# Altium footprint library con-molex.PCBLIB: 369 footprints (part 18 of 26)
Each footprint in its own frame and in the unit in brackets; x right, y up, seen from the top. Pads: shape width x height; smd on the part's side, far side on the other; paste and mask are expansions set on the pad; w line width, h text height; cw(c..) or ccw(c..) is an arc to the next point about the centre after c.
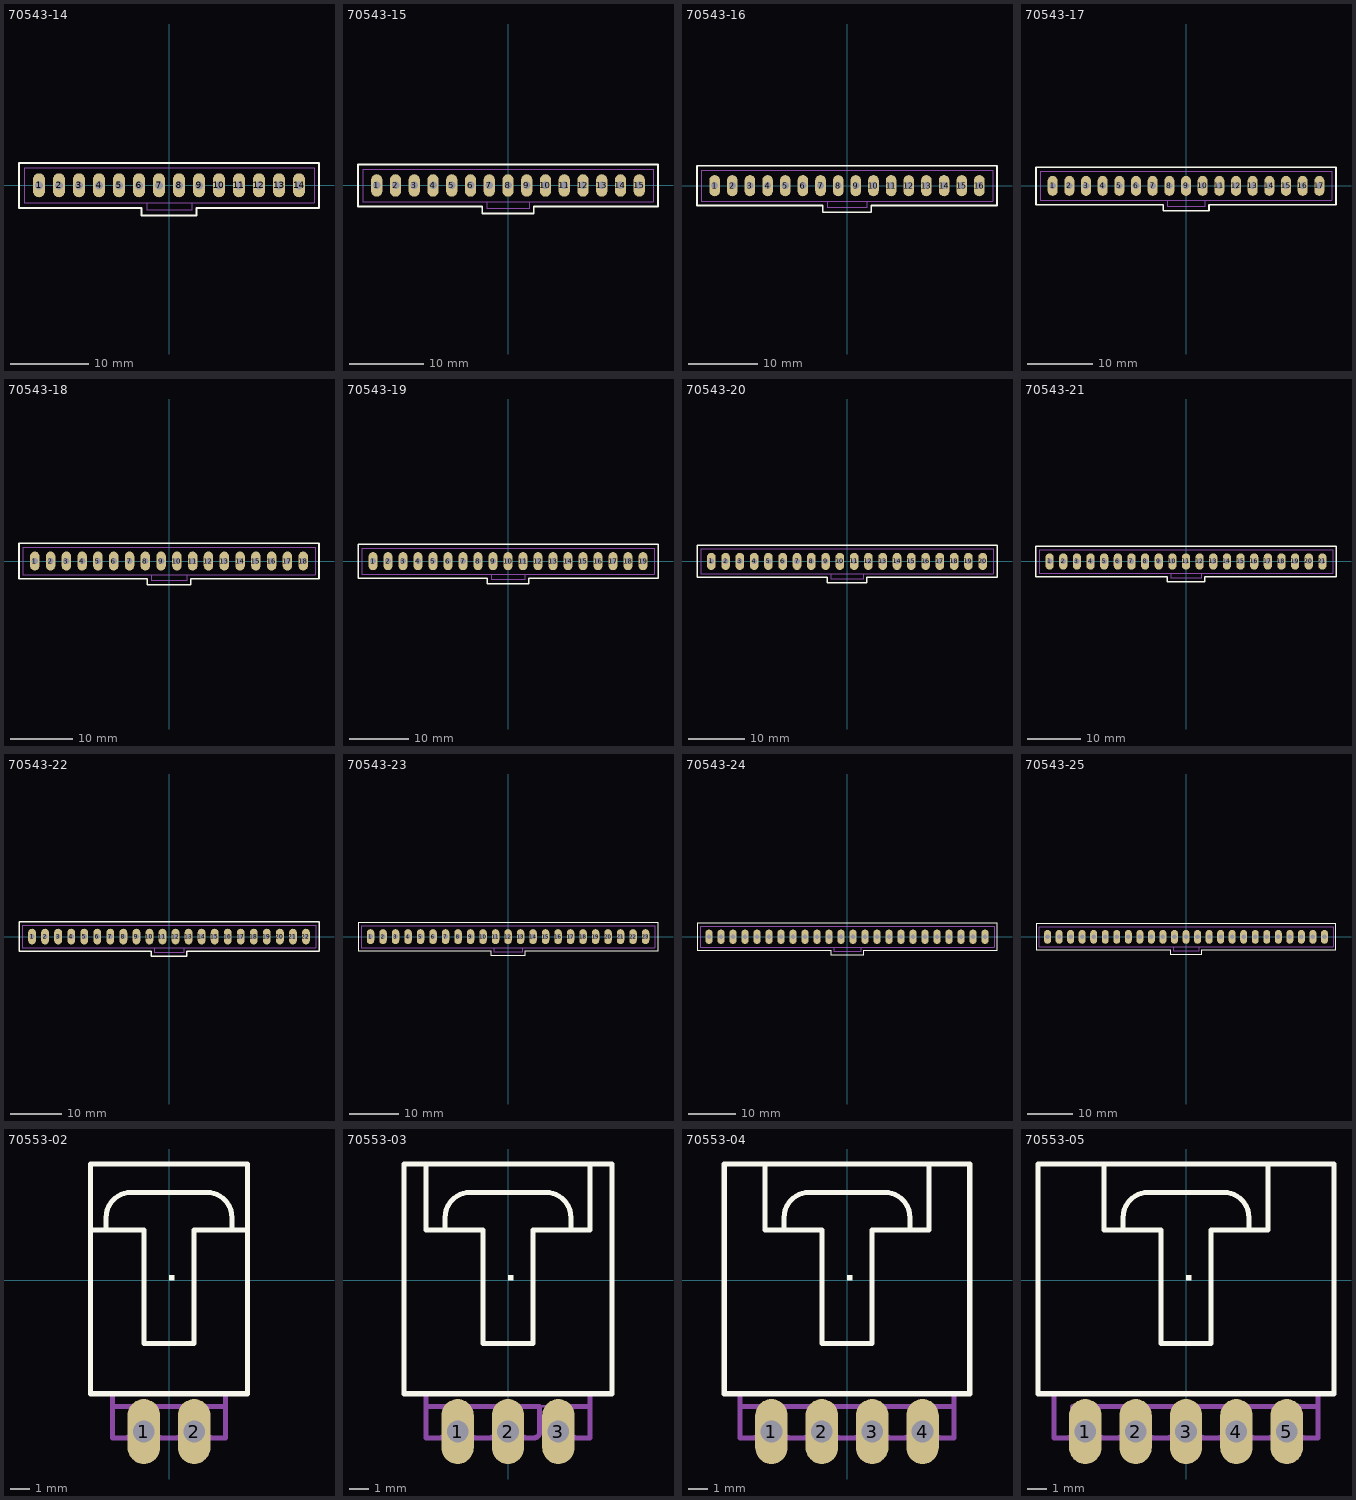
[diagram p17: the footprints below, top view; thin cyan lines are the x and y axes]

## 70543-14 [mil]
pads (14):
  oval 60x120 hole 40: 1(-650,0) 2(-550,0) 3(-450,0) 4(-350,0) 5(-250,0) 6(-150,0) 7(-50,0) 8(50,0) 9(150,0) 10(250,0) 11(350,0) 12(450,0) 13(550,0) 14(650,0)
Top Overlay:
  lines w10: -750,-112.5 -750,112.5 750,112.5 750,-112.5 137.5,-112.5 137.5,-150 -137.5,-150 -137.5,-112.5 -750,-112.5
Mechanical 16:
  rectangle: -559.37,-9.37 -540.63,9.37
  rectangle: -659.37,-9.37 -640.63,9.37
  rectangle: -359.37,-9.37 -340.63,9.37
  rectangle: -459.37,-9.37 -440.63,9.37
  rectangle: -159.37,-9.37 -140.63,9.37
  rectangle: -259.37,-9.37 -240.63,9.37
  rectangle: 40.63,-9.37 59.37,9.37
  rectangle: -59.37,-9.37 -40.63,9.37
  rectangle: 240.63,-9.37 259.37,9.37
  rectangle: 140.63,-9.37 159.37,9.37
  rectangle: 440.63,-9.37 459.37,9.37
  rectangle: 340.63,-9.37 359.37,9.37
  rectangle: 540.63,-9.37 559.37,9.37
  rectangle: 640.63,-9.37 659.37,9.37
  lines w2: -112.5,-87.5 -725,-87.5 -725,87.5 725,87.5 725,-87.5 112.5,-87.5 ; -112.5,-87.5 112.5,-87.5 ; -112.5,-87.5 -112.5,-125 112.5,-125 112.5,-87.5
  text "1" at -712.5,-62.5 h62

## 70543-15 [mil]
pads (15):
  oval 60x120 hole 40: 1(-700,0) 2(-600,0) 3(-500,0) 4(-400,0) 5(-300,0) 6(-200,0) 7(-100,0) 8(0,0) 9(100,0) 10(200,0) 11(300,0) 12(400,0) 13(500,0) 14(600,0) 15(700,0)
Top Overlay:
  lines w10: -800,-112.5 -800,112.5 800,112.5 800,-112.5 137.5,-112.5 137.5,-150 -137.5,-150 -137.5,-112.5 -800,-112.5
Mechanical 16:
  rectangle: -609.37,-9.37 -590.63,9.37
  rectangle: -709.37,-9.37 -690.63,9.37
  rectangle: -409.37,-9.37 -390.63,9.37
  rectangle: -509.37,-9.37 -490.63,9.37
  rectangle: -209.37,-9.37 -190.63,9.37
  rectangle: -309.37,-9.37 -290.63,9.37
  rectangle: -9.37,-9.37 9.37,9.37
  rectangle: -109.37,-9.37 -90.63,9.37
  rectangle: 190.63,-9.37 209.37,9.37
  rectangle: 90.63,-9.37 109.37,9.37
  rectangle: 390.63,-9.37 409.37,9.37
  rectangle: 290.63,-9.37 309.37,9.37
  rectangle: 490.63,-9.37 509.37,9.37
  rectangle: 590.63,-9.37 609.37,9.37
  rectangle: 690.63,-9.37 709.37,9.37
  lines w2: -112.5,-87.5 -775,-87.5 -775,87.5 775,87.5 775,-87.5 112.5,-87.5 ; -112.5,-87.5 112.5,-87.5 ; -112.5,-87.5 -112.5,-125 112.5,-125 112.5,-87.5
  text "1" at -762.5,-62.5 h62

## 70543-16 [mil]
pads (16):
  oval 60x120 hole 40: 1(-750,0) 2(-650,0) 3(-550,0) 4(-450,0) 5(-350,0) 6(-250,0) 7(-150,0) 8(-50,0) 9(50,0) 10(150,0) 11(250,0) 12(350,0) 13(450,0) 14(550,0) 15(650,0) 16(750,0)
Top Overlay:
  lines w10: -850,-112.5 -850,112.5 850,112.5 850,-112.5 137.5,-112.5 137.5,-150 -137.5,-150 -137.5,-112.5 -850,-112.5
Mechanical 16:
  rectangle: -659.37,-9.37 -640.63,9.37
  rectangle: -759.37,-9.37 -740.63,9.37
  rectangle: -459.37,-9.37 -440.63,9.37
  rectangle: -559.37,-9.37 -540.63,9.37
  rectangle: -259.37,-9.37 -240.63,9.37
  rectangle: -359.37,-9.37 -340.63,9.37
  rectangle: -59.37,-9.37 -40.63,9.37
  rectangle: -159.37,-9.37 -140.63,9.37
  rectangle: 140.63,-9.37 159.37,9.37
  rectangle: 40.63,-9.37 59.37,9.37
  rectangle: 340.63,-9.37 359.37,9.37
  rectangle: 240.63,-9.37 259.37,9.37
  rectangle: 440.63,-9.37 459.37,9.37
  rectangle: 540.63,-9.37 559.37,9.37
  rectangle: 640.63,-9.37 659.37,9.37
  rectangle: 740.63,-9.37 759.37,9.37
  lines w2: -112.5,-87.5 -825,-87.5 -825,87.5 825,87.5 825,-87.5 112.5,-87.5 ; -112.5,-87.5 112.5,-87.5 ; -112.5,-87.5 -112.5,-125 112.5,-125 112.5,-87.5
  text "1" at -812.5,-62.5 h62

## 70543-17 [mil]
pads (17):
  oval 60x120 hole 40: 1(-800,0) 2(-700,0) 3(-600,0) 4(-500,0) 5(-400,0) 6(-300,0) 7(-200,0) 8(-100,0) 9(0,0) 10(100,0) 11(200,0) 12(300,0) 13(400,0) 14(500,0) 15(600,0) 16(700,0) 17(800,0)
Top Overlay:
  lines w10: -900,-112.5 -900,112.5 900,112.5 900,-112.5 137.5,-112.5 137.5,-150 -137.5,-150 -137.5,-112.5 -900,-112.5
Mechanical 16:
  rectangle: -709.37,-9.37 -690.63,9.37
  rectangle: -809.37,-9.37 -790.63,9.37
  rectangle: -509.37,-9.37 -490.63,9.37
  rectangle: -609.37,-9.37 -590.63,9.37
  rectangle: -309.37,-9.37 -290.63,9.37
  rectangle: -409.37,-9.37 -390.63,9.37
  rectangle: -109.37,-9.37 -90.63,9.37
  rectangle: -209.37,-9.37 -190.63,9.37
  rectangle: 90.63,-9.37 109.37,9.37
  rectangle: -9.37,-9.37 9.37,9.37
  rectangle: 290.63,-9.37 309.37,9.37
  rectangle: 190.63,-9.37 209.37,9.37
  rectangle: 390.63,-9.37 409.37,9.37
  rectangle: 490.63,-9.37 509.37,9.37
  rectangle: 590.63,-9.37 609.37,9.37
  rectangle: 690.63,-9.37 709.37,9.37
  rectangle: 790.63,-9.37 809.37,9.37
  lines w2: -112.5,-87.5 -875,-87.5 -875,87.5 875,87.5 875,-87.5 112.5,-87.5 ; -112.5,-87.5 112.5,-87.5 ; -112.5,-87.5 -112.5,-125 112.5,-125 112.5,-87.5
  text "1" at -862.5,-62.5 h62

## 70543-18 [mil]
pads (18):
  oval 60x120 hole 40: 1(-850,0) 2(-750,0) 3(-650,0) 4(-550,0) 5(-450,0) 6(-350,0) 7(-250,0) 8(-150,0) 9(-50,0) 10(50,0) 11(150,0) 12(250,0) 13(350,0) 14(450,0) 15(550,0) 16(650,0) 17(750,0) 18(850,0)
Top Overlay:
  lines w10: -950,-112.5 -950,112.5 950,112.5 950,-112.5 137.5,-112.5 137.5,-150 -137.5,-150 -137.5,-112.5 -950,-112.5
Mechanical 16:
  rectangle: -759.37,-9.37 -740.63,9.37
  rectangle: -859.37,-9.37 -840.63,9.37
  rectangle: -559.37,-9.37 -540.63,9.37
  rectangle: -659.37,-9.37 -640.63,9.37
  rectangle: -359.37,-9.37 -340.63,9.37
  rectangle: -459.37,-9.37 -440.63,9.37
  rectangle: -159.37,-9.37 -140.63,9.37
  rectangle: -259.37,-9.37 -240.63,9.37
  rectangle: 40.63,-9.37 59.37,9.37
  rectangle: -59.37,-9.37 -40.63,9.37
  rectangle: 240.63,-9.37 259.37,9.37
  rectangle: 140.63,-9.37 159.37,9.37
  rectangle: 340.63,-9.37 359.37,9.37
  rectangle: 440.63,-9.37 459.37,9.37
  rectangle: 540.63,-9.37 559.37,9.37
  rectangle: 640.63,-9.37 659.37,9.37
  rectangle: 740.63,-9.37 759.37,9.37
  rectangle: 840.63,-9.37 859.37,9.37
  lines w2: -112.5,-87.5 -925,-87.5 -925,87.5 925,87.5 925,-87.5 112.5,-87.5 ; -112.5,-87.5 112.5,-87.5 ; -112.5,-87.5 -112.5,-125 112.5,-125 112.5,-87.5
  text "1" at -912.5,-62.5 h62

## 70543-19 [mil]
pads (19):
  oval 60x120 hole 40: 1(-900,0) 2(-800,0) 3(-700,0) 4(-600,0) 5(-500,0) 6(-400,0) 7(-300,0) 8(-200,0) 9(-100,0) 10(0,0) 11(100,0) 12(200,0) 13(300,0) 14(400,0) 15(500,0) 16(600,0) 17(700,0) 18(800,0) 19(900,0)
Top Overlay:
  lines w10: -1000,-112.5 -1000,112.5 1000,112.5 1000,-112.5 137.5,-112.5 137.5,-150 -137.5,-150 -137.5,-112.5 -1000,-112.5
Mechanical 16:
  rectangle: -809.37,-9.37 -790.63,9.37
  rectangle: -909.37,-9.37 -890.63,9.37
  rectangle: -609.37,-9.37 -590.63,9.37
  rectangle: -709.37,-9.37 -690.63,9.37
  rectangle: -409.37,-9.37 -390.63,9.37
  rectangle: -509.37,-9.37 -490.63,9.37
  rectangle: -209.37,-9.37 -190.63,9.37
  rectangle: -309.37,-9.37 -290.63,9.37
  rectangle: -9.37,-9.37 9.37,9.37
  rectangle: -109.37,-9.37 -90.63,9.37
  rectangle: 190.63,-9.37 209.37,9.37
  rectangle: 90.63,-9.37 109.37,9.37
  rectangle: 290.63,-9.37 309.37,9.37
  rectangle: 390.63,-9.37 409.37,9.37
  rectangle: 490.63,-9.37 509.37,9.37
  rectangle: 590.63,-9.37 609.37,9.37
  rectangle: 690.63,-9.37 709.37,9.37
  rectangle: 790.63,-9.37 809.37,9.37
  rectangle: 890.63,-9.37 909.37,9.37
  lines w2: -112.5,-87.5 -975,-87.5 -975,87.5 975,87.5 975,-87.5 112.5,-87.5 ; -112.5,-87.5 112.5,-87.5 ; -112.5,-87.5 -112.5,-125 112.5,-125 112.5,-87.5
  text "1" at -962.5,-62.5 h62

## 70543-20 [mil]
pads (20):
  oval 60x120 hole 40: 1(-950,0) 2(-850,0) 3(-750,0) 4(-650,0) 5(-550,0) 6(-450,0) 7(-350,0) 8(-250,0) 9(-150,0) 10(-50,0) 11(50,0) 12(150,0) 13(250,0) 14(350,0) 15(450,0) 16(550,0) 17(650,0) 18(750,0) 19(850,0) 20(950,0)
Top Overlay:
  lines w10: -1050,-112.5 -1050,112.5 1050,112.5 1050,-112.5 137.5,-112.5 137.5,-150 -137.5,-150 -137.5,-112.5 -1050,-112.5
Mechanical 16:
  rectangle: -859.37,-9.37 -840.63,9.37
  rectangle: -959.37,-9.37 -940.63,9.37
  rectangle: -659.37,-9.37 -640.63,9.37
  rectangle: -759.37,-9.37 -740.63,9.37
  rectangle: -459.37,-9.37 -440.63,9.37
  rectangle: -559.37,-9.37 -540.63,9.37
  rectangle: -259.37,-9.37 -240.63,9.37
  rectangle: -359.37,-9.37 -340.63,9.37
  rectangle: -59.37,-9.37 -40.63,9.37
  rectangle: -159.37,-9.37 -140.63,9.37
  rectangle: 140.63,-9.37 159.37,9.37
  rectangle: 40.63,-9.37 59.37,9.37
  rectangle: 240.63,-9.37 259.37,9.37
  rectangle: 340.63,-9.37 359.37,9.37
  rectangle: 440.63,-9.37 459.37,9.37
  rectangle: 540.63,-9.37 559.37,9.37
  rectangle: 640.63,-9.37 659.37,9.37
  rectangle: 740.63,-9.37 759.37,9.37
  rectangle: 840.63,-9.37 859.37,9.37
  rectangle: 940.63,-9.37 959.37,9.37
  lines w2: -112.5,-87.5 -1025,-87.5 -1025,87.5 1025,87.5 1025,-87.5 112.5,-87.5 ; -112.5,-87.5 112.5,-87.5 ; -112.5,-87.5 -112.5,-125 112.5,-125 112.5,-87.5
  text "1" at -1012.5,-62.5 h62

## 70543-21 [mil]
pads (21):
  oval 60x120 hole 40: 1(-1000,0) 2(-900,0) 3(-800,0) 4(-700,0) 5(-600,0) 6(-500,0) 7(-400,0) 8(-300,0) 9(-200,0) 10(-100,0) 11(0,0) 12(100,0) 13(200,0) 14(300,0) 15(400,0) 16(500,0) 17(600,0) 18(700,0) 19(800,0) 20(900,0) 21(1000,0)
Top Overlay:
  lines w10: -1100,-112.5 -1100,112.5 1100,112.5 1100,-112.5 137.5,-112.5 137.5,-150 -137.5,-150 -137.5,-112.5 -1100,-112.5
Mechanical 16:
  rectangle: -909.37,-9.37 -890.63,9.37
  rectangle: -1009.37,-9.37 -990.63,9.37
  rectangle: -709.37,-9.37 -690.63,9.37
  rectangle: -809.37,-9.37 -790.63,9.37
  rectangle: -509.37,-9.37 -490.63,9.37
  rectangle: -609.37,-9.37 -590.63,9.37
  rectangle: -309.37,-9.37 -290.63,9.37
  rectangle: -409.37,-9.37 -390.63,9.37
  rectangle: -109.37,-9.37 -90.63,9.37
  rectangle: -209.37,-9.37 -190.63,9.37
  rectangle: 90.63,-9.37 109.37,9.37
  rectangle: -9.37,-9.37 9.37,9.37
  rectangle: 190.63,-9.37 209.37,9.37
  rectangle: 290.63,-9.37 309.37,9.37
  rectangle: 390.63,-9.37 409.37,9.37
  rectangle: 490.63,-9.37 509.37,9.37
  rectangle: 590.63,-9.37 609.37,9.37
  rectangle: 690.63,-9.37 709.37,9.37
  rectangle: 790.63,-9.37 809.37,9.37
  rectangle: 890.63,-9.37 909.37,9.37
  rectangle: 990.63,-9.37 1009.37,9.37
  lines w2: -112.5,-87.5 -1075,-87.5 -1075,87.5 1075,87.5 1075,-87.5 112.5,-87.5 ; -112.5,-87.5 112.5,-87.5 ; -112.5,-87.5 -112.5,-125 112.5,-125 112.5,-87.5
  text "1" at -1062.5,-62.5 h62

## 70543-22 [mil]
pads (22):
  oval 60x120 hole 40: 1(-1050,0) 2(-950,0) 3(-850,0) 4(-750,0) 5(-650,0) 6(-550,0) 7(-450,0) 8(-350,0) 9(-250,0) 10(-150,0) 11(-50,0) 12(50,0) 13(150,0) 14(250,0) 15(350,0) 16(450,0) 17(550,0) 18(650,0) 19(750,0) 20(850,0) 21(950,0) 22(1050,0)
Top Overlay:
  lines w10: -1150,-112.5 -1150,112.5 1150,112.5 1150,-112.5 137.5,-112.5 137.5,-150 -137.5,-150 -137.5,-112.5 -1150,-112.5
Mechanical 16:
  rectangle: -959.37,-9.37 -940.63,9.37
  rectangle: -1059.37,-9.37 -1040.63,9.37
  rectangle: -759.37,-9.37 -740.63,9.37
  rectangle: -859.37,-9.37 -840.63,9.37
  rectangle: -559.37,-9.37 -540.63,9.37
  rectangle: -659.37,-9.37 -640.63,9.37
  rectangle: -359.37,-9.37 -340.63,9.37
  rectangle: -459.37,-9.37 -440.63,9.37
  rectangle: -159.37,-9.37 -140.63,9.37
  rectangle: -259.37,-9.37 -240.63,9.37
  rectangle: 40.63,-9.37 59.37,9.37
  rectangle: -59.37,-9.37 -40.63,9.37
  rectangle: 140.63,-9.37 159.37,9.37
  rectangle: 240.63,-9.37 259.37,9.37
  rectangle: 340.63,-9.37 359.37,9.37
  rectangle: 440.63,-9.37 459.37,9.37
  rectangle: 540.63,-9.37 559.37,9.37
  rectangle: 640.63,-9.37 659.37,9.37
  rectangle: 740.63,-9.37 759.37,9.37
  rectangle: 840.63,-9.37 859.37,9.37
  rectangle: 940.63,-9.37 959.37,9.37
  rectangle: 1040.63,-9.37 1059.37,9.37
  lines w2: -112.5,-87.5 -1125,-87.5 -1125,87.5 1125,87.5 1125,-87.5 112.5,-87.5 ; -112.5,-87.5 112.5,-87.5 ; -112.5,-87.5 -112.5,-125 112.5,-125 112.5,-87.5
  text "1" at -1112.5,-62.5 h62

## 70543-23 [mil]
pads (23):
  oval 60x120 hole 40: 1(-1100,0) 2(-1000,0) 3(-900,0) 4(-800,0) 5(-700,0) 6(-600,0) 7(-500,0) 8(-400,0) 9(-300,0) 10(-200,0) 11(-100,0) 12(0,0) 13(100,0) 14(200,0) 15(300,0) 16(400,0) 17(500,0) 18(600,0) 19(700,0) 20(800,0) 21(900,0) 22(1000,0) 23(1100,0)
Top Overlay:
  lines w10: -1200,-112.5 -1200,112.5 1200,112.5 1200,-112.5 137.5,-112.5 137.5,-150 -137.5,-150 -137.5,-112.5 -1200,-112.5
Mechanical 16:
  rectangle: -1009.37,-9.37 -990.63,9.37
  rectangle: -1109.37,-9.37 -1090.63,9.37
  rectangle: -809.37,-9.37 -790.63,9.37
  rectangle: -909.37,-9.37 -890.63,9.37
  rectangle: -609.37,-9.37 -590.63,9.37
  rectangle: -709.37,-9.37 -690.63,9.37
  rectangle: -409.37,-9.37 -390.63,9.37
  rectangle: -509.37,-9.37 -490.63,9.37
  rectangle: -209.37,-9.37 -190.63,9.37
  rectangle: -309.37,-9.37 -290.63,9.37
  rectangle: -9.37,-9.37 9.37,9.37
  rectangle: -109.37,-9.37 -90.63,9.37
  rectangle: 90.63,-9.37 109.37,9.37
  rectangle: 190.63,-9.37 209.37,9.37
  rectangle: 290.63,-9.37 309.37,9.37
  rectangle: 390.63,-9.37 409.37,9.37
  rectangle: 490.63,-9.37 509.37,9.37
  rectangle: 590.63,-9.37 609.37,9.37
  rectangle: 690.63,-9.37 709.37,9.37
  rectangle: 790.63,-9.37 809.37,9.37
  rectangle: 890.63,-9.37 909.37,9.37
  rectangle: 990.63,-9.37 1009.37,9.37
  rectangle: 1090.63,-9.37 1109.37,9.37
  lines w2: -112.5,-87.5 -1175,-87.5 -1175,87.5 1175,87.5 1175,-87.5 112.5,-87.5 ; -112.5,-87.5 112.5,-87.5 ; -112.5,-87.5 -112.5,-125 112.5,-125 112.5,-87.5
  text "1" at -1162.5,-62.5 h62

## 70543-24 [mil]
pads (24):
  oval 60x120 hole 40: 1(-1150,0) 2(-1050,0) 3(-950,0) 4(-850,0) 5(-750,0) 6(-650,0) 7(-550,0) 8(-450,0) 9(-350,0) 10(-250,0) 11(-150,0) 12(-50,0) 13(50,0) 14(150,0) 15(250,0) 16(350,0) 17(450,0) 18(550,0) 19(650,0) 20(750,0) 21(850,0) 22(950,0) 23(1050,0) 24(1150,0)
Top Overlay:
  lines w10: -1250,-112.5 -1250,112.5 1250,112.5 1250,-112.5 137.5,-112.5 137.5,-150 -137.5,-150 -137.5,-112.5 -1250,-112.5
Mechanical 16:
  rectangle: -1059.37,-9.37 -1040.63,9.37
  rectangle: -1159.37,-9.37 -1140.63,9.37
  rectangle: -859.37,-9.37 -840.63,9.37
  rectangle: -959.37,-9.37 -940.63,9.37
  rectangle: -659.37,-9.37 -640.63,9.37
  rectangle: -759.37,-9.37 -740.63,9.37
  rectangle: -459.37,-9.37 -440.63,9.37
  rectangle: -559.37,-9.37 -540.63,9.37
  rectangle: -259.37,-9.37 -240.63,9.37
  rectangle: -359.37,-9.37 -340.63,9.37
  rectangle: -59.37,-9.37 -40.63,9.37
  rectangle: -159.37,-9.37 -140.63,9.37
  rectangle: 40.63,-9.37 59.37,9.37
  rectangle: 140.63,-9.37 159.37,9.37
  rectangle: 240.63,-9.37 259.37,9.37
  rectangle: 340.63,-9.37 359.37,9.37
  rectangle: 440.63,-9.37 459.37,9.37
  rectangle: 540.63,-9.37 559.37,9.37
  rectangle: 640.63,-9.37 659.37,9.37
  rectangle: 740.63,-9.37 759.37,9.37
  rectangle: 840.63,-9.37 859.37,9.37
  rectangle: 940.63,-9.37 959.37,9.37
  rectangle: 1040.63,-9.37 1059.37,9.37
  rectangle: 1140.63,-9.37 1159.37,9.37
  lines w2: -112.5,-87.5 -1225,-87.5 -1225,87.5 1225,87.5 1225,-87.5 112.5,-87.5 ; -112.5,-87.5 112.5,-87.5 ; -112.5,-87.5 -112.5,-125 112.5,-125 112.5,-87.5
  text "1" at -1212.5,-62.5 h62

## 70543-25 [mil]
pads (25):
  oval 60x120 hole 40: 1(-1200,0) 2(-1100,0) 3(-1000,0) 4(-900,0) 5(-800,0) 6(-700,0) 7(-600,0) 8(-500,0) 9(-400,0) 10(-300,0) 11(-200,0) 12(-100,0) 13(0,0) 14(100,0) 15(200,0) 16(300,0) 17(400,0) 18(500,0) 19(600,0) 20(700,0) 21(800,0) 22(900,0) 23(1000,0) 24(1100,0) 25(1200,0)
Top Overlay:
  lines w10: -1300,-112.5 -1300,112.5 1300,112.5 1300,-112.5 137.5,-112.5 137.5,-150 -137.5,-150 -137.5,-112.5 -1300,-112.5
Mechanical 16:
  rectangle: -1109.37,-9.37 -1090.63,9.37
  rectangle: -1209.37,-9.37 -1190.63,9.37
  rectangle: -909.37,-9.37 -890.63,9.37
  rectangle: -1009.37,-9.37 -990.63,9.37
  rectangle: -709.37,-9.37 -690.63,9.37
  rectangle: -809.37,-9.37 -790.63,9.37
  rectangle: -509.37,-9.37 -490.63,9.37
  rectangle: -609.37,-9.37 -590.63,9.37
  rectangle: -309.37,-9.37 -290.63,9.37
  rectangle: -409.37,-9.37 -390.63,9.37
  rectangle: -109.37,-9.37 -90.63,9.37
  rectangle: -209.37,-9.37 -190.63,9.37
  rectangle: -9.37,-9.37 9.37,9.37
  rectangle: 90.63,-9.37 109.37,9.37
  rectangle: 190.63,-9.37 209.37,9.37
  rectangle: 290.63,-9.37 309.37,9.37
  rectangle: 390.63,-9.37 409.37,9.37
  rectangle: 490.63,-9.37 509.37,9.37
  rectangle: 590.63,-9.37 609.37,9.37
  rectangle: 690.63,-9.37 709.37,9.37
  rectangle: 790.63,-9.37 809.37,9.37
  rectangle: 890.63,-9.37 909.37,9.37
  rectangle: 990.63,-9.37 1009.37,9.37
  rectangle: 1090.63,-9.37 1109.37,9.37
  rectangle: 1190.63,-9.37 1209.37,9.37
  lines w2: -112.5,-87.5 -1275,-87.5 -1275,87.5 1275,87.5 1275,-87.5 112.5,-87.5 ; -112.5,-87.5 112.5,-87.5 ; -112.5,-87.5 -112.5,-125 112.5,-125 112.5,-87.5
  text "1" at -1262.5,-62.5 h62

## 70553-02 [mil]
pads (2):
  oval 64.5x129 hole 43: 1(-50,-300) 2(50,-300)
Top Overlay:
  region: 0,0 10,0 10,10 0,10
  lines w10: -156.25,100 -156.25,231.25 156.25,231.25 156.25,100 ; -156.25,100 -125,100 ; -156.25,100 -156.25,-225 156.25,-225 156.25,100 ; -125,100 -50,100 -50,-125 50,-125 50,100 125,100 ; -125,100 -125,125 cw(c-75,125) -75,175 75,175 cw(c75,125) 125,125 125,100 ; 125,100 156.25,100
Mechanical 16:
  rectangle: -62.5,-300 -37.5,-250
  rectangle: 37.5,-300 62.5,-250
  lines w5: -75,-250 -25,-250 ; 25,-250 75,-250
  lines w10: -112.5,-225 -112.5,-250 ; 112.5,-225 112.5,-250 ; -112.5,-250 -112.5,-312.5 -85,-312.5 ccw(c-85,-302.5) -75,-302.5 -75,-250 -112.5,-250 ; 112.5,-250 112.5,-312.5 85,-312.5 cw(c85,-302.5) 75,-302.5 75,-250 112.5,-250 ; -25,-302.5 -25,-250 25,-250 25,-302.5 cw(c15,-302.5) 15,-312.5 -15,-312.5 cw(c-15,-302.5) -25,-302.5

## 70553-03 [mil]
pads (3):
  oval 64.5x129 hole 43: 1(-100,-300) 2(0,-300) 3(100,-300)
Top Overlay:
  region: 0,0 10,0 10,10 0,10
  lines w10: -162.5,231.25 -162.5,100 -125,100 ; -125,100 -50,100 -50,-125 50,-125 50,100 125,100 ; -125,100 -125,125 cw(c-75,125) -75,175 75,175 cw(c75,125) 125,125 125,100 ; 125,100 162.5,100 162.5,231.25 ; 162.5,231.25 206.25,231.25 206.25,-225 -206.25,-225 -206.25,231.25 162.5,231.25
Mechanical 16:
  rectangle: -112.5,-300 -87.5,-250
  rectangle: -12.5,-300 12.5,-250
  rectangle: 87.5,-300 112.5,-250
  lines w5: -125,-250 -75,-250 ; -25,-250 25,-250 ; 62.5,-250 125,-250
  lines w10: -162.5,-225 -162.5,-250 ; 162.5,-225 162.5,-250 ; -162.5,-250 -162.5,-312.5 -135,-312.5 ccw(c-135,-302.5) -125,-302.5 -125,-250 -162.5,-250 ; 162.5,-250 162.5,-312.5 135,-312.5 cw(c135,-302.5) 125,-302.5 125,-250 162.5,-250 ; -75,-302.5 -75,-250 -25,-250 -25,-302.5 cw(c-35,-302.5) -35,-312.5 -65,-312.5 cw(c-65,-302.5) -75,-302.5 ; 25,-302.5 25,-250 62.5,-250 62.5,-302.5 cw(c52.5,-302.5) 52.5,-312.5 35,-312.5 cw(c35,-302.5) 25,-302.5

## 70553-04 [mil]
pads (4):
  oval 64.5x129 hole 43: 1(-150,-300) 2(-50,-300) 3(50,-300) 4(150,-300)
Top Overlay:
  region: 0,0 10,0 10,10 0,10
  lines w10: -162.5,231.25 -162.5,100 -125,100 ; -125,100 -50,100 -50,-125 50,-125 50,100 125,100 ; -125,100 -125,125 cw(c-75,125) -75,175 75,175 cw(c75,125) 125,125 125,100 ; 125,100 162.5,100 162.5,231.25 ; 162.5,231.25 243.75,231.25 243.75,-225 -243.75,-225 -243.75,231.25 162.5,231.25
Mechanical 16:
  rectangle: -162.5,-300 -137.5,-250
  rectangle: -62.5,-300 -37.5,-250
  rectangle: 37.5,-300 62.5,-250
  rectangle: 137.5,-300 162.5,-250
  lines w5: -75,-250 -25,-250 ; 25,-250 75,-250 ; 125,-250 175,-250
  lines w10: -212.5,-225 -212.5,-250 ; -175,-250 -175,-302.5 cw(c-185,-302.5) -185,-312.5 -212.5,-312.5 -212.5,-250 ; 212.5,-225 212.5,-250 ; -212.5,-250 -125,-250 ; -125,-250 -75,-250 -75,-302.5 cw(c-85,-302.5) -85,-312.5 -115,-312.5 cw(c-115,-302.5) -125,-302.5 -125,-250 ; 212.5,-250 212.5,-312.5 185,-312.5 cw(c185,-302.5) 175,-302.5 175,-250 212.5,-250 ; -25,-302.5 -25,-250 25,-250 25,-302.5 cw(c15,-302.5) 15,-312.5 -15,-312.5 cw(c-15,-302.5) -25,-302.5 ; 75,-302.5 75,-250 125,-250 125,-302.5 cw(c115,-302.5) 115,-312.5 85,-312.5 cw(c85,-302.5) 75,-302.5

## 70553-05 [mil]
pads (5):
  oval 64.5x129 hole 43: 1(-200,-300) 2(-100,-300) 3(0,-300) 4(100,-300) 5(200,-300)
Top Overlay:
  region: 0,0 10,0 10,10 0,10
  lines w10: -162.5,231.25 -162.5,100 -125,100 ; -125,100 -50,100 -50,-125 50,-125 50,100 125,100 ; -125,100 -125,125 cw(c-75,125) -75,175 75,175 cw(c75,125) 125,125 125,100 ; 125,100 162.5,100 162.5,231.25 ; 162.5,231.25 293.75,231.25 293.75,-225 -293.75,-225 -293.75,231.25 162.5,231.25
Mechanical 16:
  rectangle: -212.5,-300 -187.5,-250
  rectangle: -112.5,-300 -87.5,-250
  rectangle: -12.5,-300 12.5,-250
  rectangle: 87.5,-300 112.5,-250
  rectangle: 187.5,-300 212.5,-250
  lines w5: -225,-250 -175,-250 ; -125,-250 -75,-250 ; -25,-250 25,-250 ; 75,-250 125,-250 ; 175,-250 225,-250
  lines w10: -262.5,-225 -262.5,-312.5 -235,-312.5 ccw(c-235,-302.5) -225,-302.5 -225,-250 ; 262.5,-225 262.5,-250 ; 262.5,-250 262.5,-312.5 235,-312.5 cw(c235,-302.5) 225,-302.5 225,-250 262.5,-250 ; -175,-302.5 -175,-250 -125,-250 -125,-302.5 cw(c-135,-302.5) -135,-312.5 -165,-312.5 cw(c-165,-302.5) -175,-302.5 ; -75,-302.5 -75,-250 -25,-250 -25,-302.5 cw(c-35,-302.5) -35,-312.5 -65,-312.5 cw(c-65,-302.5) -75,-302.5 ; 25,-302.5 25,-250 75,-250 75,-302.5 cw(c65,-302.5) 65,-312.5 35,-312.5 cw(c35,-302.5) 25,-302.5 ; 125,-302.5 125,-250 175,-250 175,-302.5 cw(c165,-302.5) 165,-312.5 135,-312.5 cw(c135,-302.5) 125,-302.5